# Altium footprint library 3D_MIG_Controller.PCBLIB: 560 footprints (part 29 of 35)
Each footprint in its own frame and in the unit in brackets; x right, y up, seen from the top. Pads: shape width x height; smd on the part's side, far side on the other; paste and mask are expansions set on the pad; w line width, h text height; cw(c..) or ccw(c..) is an arc to the next point about the centre after c.
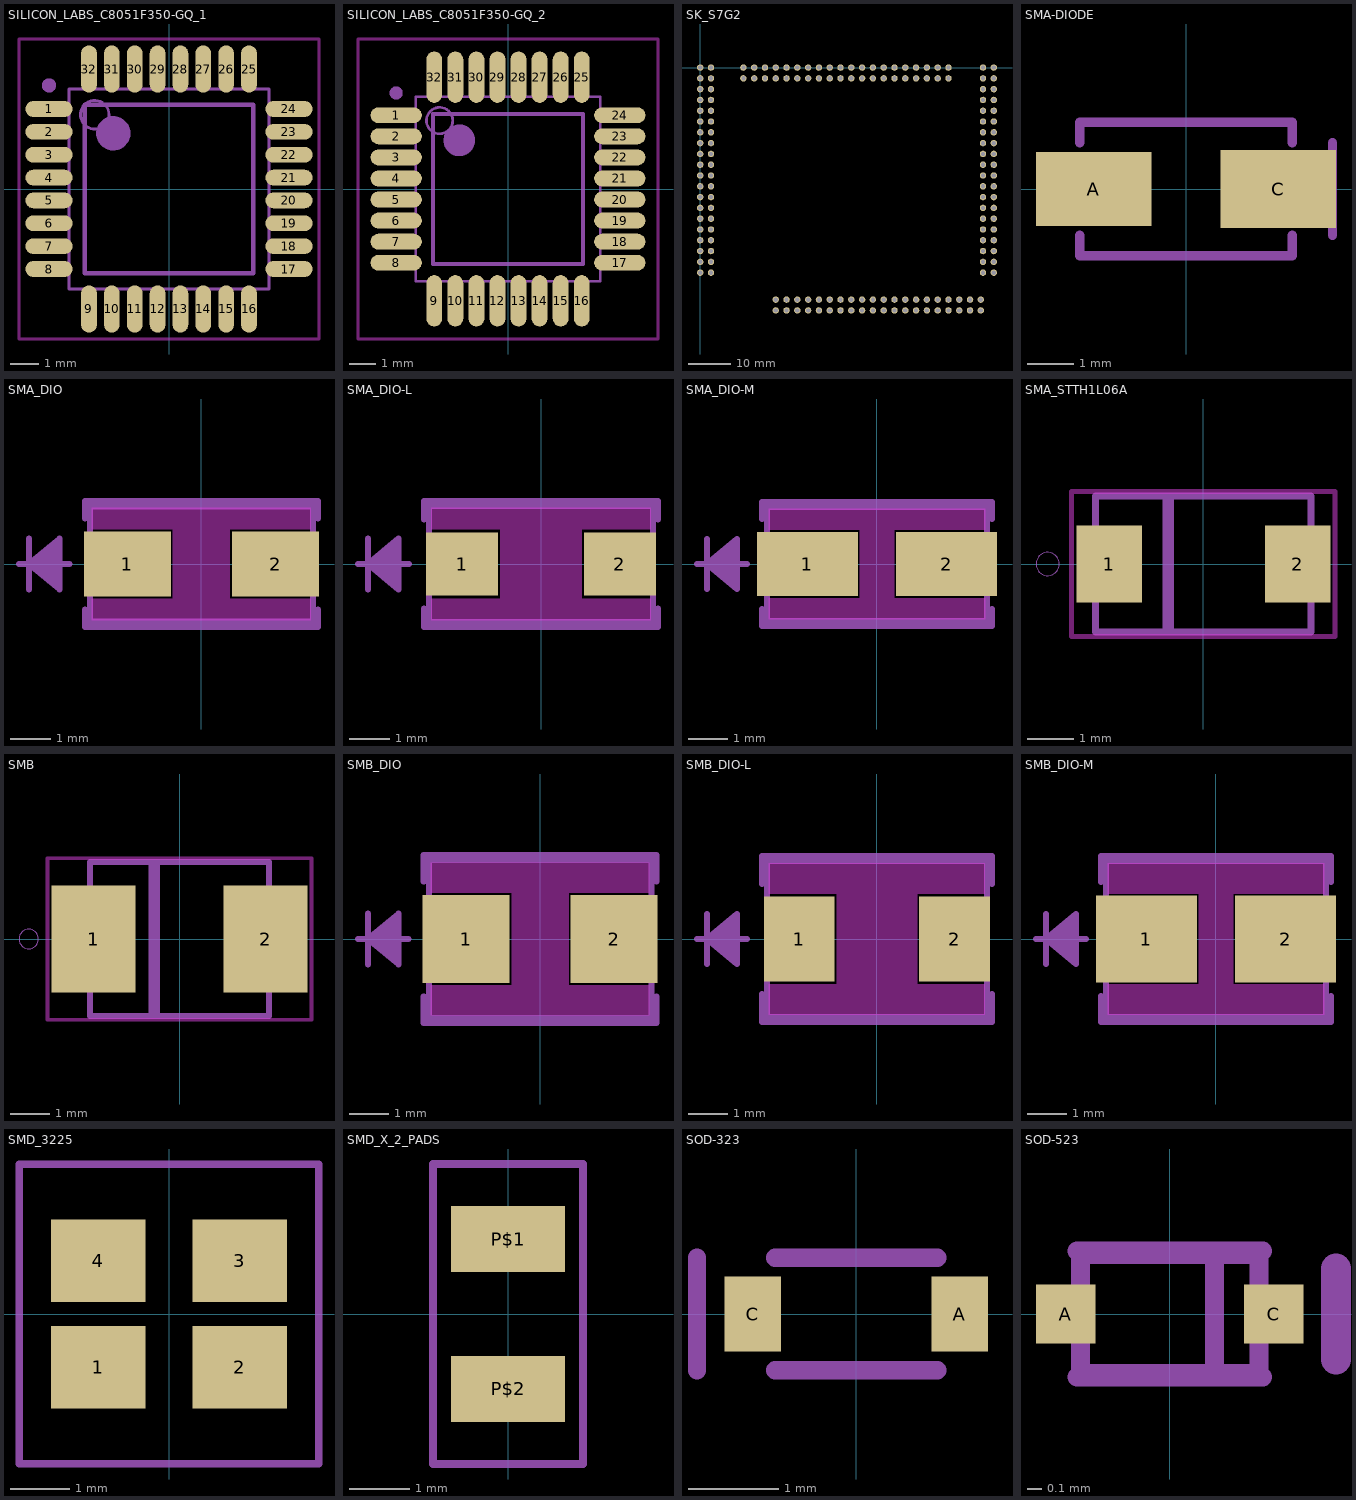
[diagram p28: the footprints below, top view; thin cyan lines are the x and y axes]

## SILICON_LABS_C8051F350-GQ_1 [mm]
pads (32):
  rrect100% 1.65x0.55 smd: 1(-4.2,2.8) 2(-4.2,2) 3(-4.2,1.2) 4(-4.2,0.4) 5(-4.2,-0.4) 6(-4.2,-1.2) 7(-4.2,-2) 8(-4.2,-2.8) 17(4.2,-2.8) 18(4.2,-2) 19(4.2,-1.2) 20(4.2,-0.4) 21(4.2,0.4) 22(4.2,1.2) 23(4.2,2) 24(4.2,2.8)
  rrect100% 0.55x1.65 smd: 9(-2.8,-4.2) 10(-2,-4.2) 11(-1.2,-4.2) 12(-0.4,-4.2) 13(0.4,-4.2) 14(1.2,-4.2) 15(2,-4.2) 16(2.8,-4.2) 25(2.8,4.2) 26(2,4.2) 27(1.2,4.2) 28(0.4,4.2) 29(-0.4,4.2) 30(-1.2,4.2) 31(-2,4.2) 32(-2.8,4.2)
Top keep-out:
  lines w0.1: -5.25,-5.25 -5.25,5.25 5.25,5.25 5.25,-5.25 -5.25,-5.25
tDocu:
  circle w0.1: c-2.6,2.6 r0.5
  lines w0.1: -3.5,-3.5 3.5,-3.5 3.5,3.5 -3.5,3.5 -3.5,-3.5
tPlace:
  circle w0.6: c-1.95,1.95 r0.3
  circle w0.25: c-4.2,3.625 r0.125
  lines w0.15: -2.95,-2.95 2.95,-2.95 2.95,2.95 -2.95,2.95 -2.95,-2.95

## SILICON_LABS_C8051F350-GQ_2 [mm]
pads (32):
  rrect100% 1.95x0.6 smd: 1(-4.25,2.8) 2(-4.25,2) 3(-4.25,1.2) 4(-4.25,0.4) 5(-4.25,-0.4) 6(-4.25,-1.2) 7(-4.25,-2) 8(-4.25,-2.8) 17(4.25,-2.8) 18(4.25,-2) 19(4.25,-1.2) 20(4.25,-0.4) 21(4.25,0.4) 22(4.25,1.2) 23(4.25,2) 24(4.25,2.8)
  rrect100% 0.6x1.95 smd: 9(-2.8,-4.25) 10(-2,-4.25) 11(-1.2,-4.25) 12(-0.4,-4.25) 13(0.4,-4.25) 14(1.2,-4.25) 15(2,-4.25) 16(2.8,-4.25) 25(2.8,4.25) 26(2,4.25) 27(1.2,4.25) 28(0.4,4.25) 29(-0.4,4.25) 30(-1.2,4.25) 31(-2,4.25) 32(-2.8,4.25)
Top keep-out:
  lines w0.1: -5.7,-5.7 -5.7,5.7 5.7,5.7 5.7,-5.7 -5.7,-5.7
tDocu:
  circle w0.1: c-2.6,2.6 r0.5
  lines w0.1: -3.5,-3.5 -3.5,3.5 3.5,3.5 3.5,-3.5 -3.5,-3.5
tPlace:
  circle w0.25: c-4.25,3.65 r0.125
  circle w0.6: c-1.85,1.85 r0.3
  lines w0.15: -2.85,-2.85 -2.85,2.85 2.85,2.85 2.85,-2.85 -2.85,-2.85

## SK_S7G2 [mm]
pads (160):
  round 1.508 hole 1: J20GND1(69.088,-45.72) J20GND2(66.548,-45.72) J20GND3(66.548,-2.54) J20NC1(66.548,-43.18) J20NC2(66.548,-40.64) J20NC3(66.548,-38.1) J20VCC(69.088,-2.54) J21GND1(2.54,-45.72) J21GND2(0,-2.54) J21VCC(0,-45.72) J22GND1(63.5,-54.61) J22VCC(63.5,-57.15) J23GND1(55.88,0) J23GND2(12.7,0) J23GND3(12.7,-2.54) J23NC1(33.02,0) J23NC2(35.56,-2.54) J23NC3(20.32,-2.54) J23VCC(55.88,-2.54) J2001(66.548,0) J2002(69.088,0) J2039(66.548,-48.26) J2040(69.088,-48.26) J2101(2.54,-48.26) J2102(0,-48.26) J2139(2.54,0) J2140(0,0) J2201(66.04,-54.61) J2202(66.04,-57.15) J2239(17.78,-54.61) J2240(17.78,-57.15) J2301(58.42,0) J2339(10.16,0) J2340(10.16,-2.54) J3202(58.42,-2.54) P00(66.548,-5.08) P001(66.548,-7.62) P002(66.548,-10.16) P003(66.548,-12.7) P004(66.548,-15.24) P005(66.548,-17.78) P006(66.548,-20.32) P007(66.548,-22.86) P008(66.548,-25.4) P009(66.548,-27.94) P010(66.548,-30.48) P014(66.548,-33.02) P015(66.548,-35.56) P42(53.34,-54.61) P100(69.088,-5.08) P101(69.088,-7.62) P102(69.088,-10.16) P103(69.088,-12.7) P104(69.088,-15.24) P105(69.088,-17.78) P106(69.088,-20.32) P107(69.088,-22.86) P108(69.088,-25.4) P109(69.088,-27.94) P110(69.088,-30.48) P111(69.088,-33.02) P112(69.088,-35.56) P113(69.088,-38.1) P114(69.088,-40.64) P115(69.088,-43.18) P200(2.54,-43.18) P201(2.54,-40.64) P202(2.54,-38.1) P203(2.54,-35.56) P204(2.54,-33.02) P205(2.54,-30.48) P206(2.54,-27.94) P207(2.54,-25.4) P300(0,-43.18) P301(0,-40.64) P302(0,-38.1) P303(0,-35.56) P304(0,-33.02) P305(0,-30.48) P306(0,-27.94) P307(0,-25.4) P308(0,-22.86) P309(0,-20.32) P310(0,-17.78) P311(0,-15.24) P312(0,-12.7) P313(0,-10.16) P314(0,-7.62) P315(0,-5.08) P400(2.54,-22.86) P401(2.54,-20.32) P402(2.54,-17.78) P403(2.54,-15.24) P404(2.54,-12.7) P405(2.54,-10.16) P406(2.54,-7.62) P407(2.54,-5.08) P408(2.54,-2.54) P409(60.96,-54.61) P410(58.42,-54.61) P411(55.88,-54.61) P413(50.8,-54.61) P414(48.26,-54.61) P415(45.72,-54.61) P500(43.18,-54.61) P501(40.64,-54.61) P502(38.1,-54.61) P503(35.56,-54.61) P504(33.02,-54.61) P505(30.48,-54.61) P506(27.94,-54.61) P507(25.4,-54.61) P511(22.86,-54.61) P512(20.32,-54.61) P513(20.32,-57.15) P600(60.96,-57.15) P601(58.42,-57.15) P602(55.88,-57.15) P603(53.34,-57.15) P604(50.8,-57.15) P605(48.26,-57.15) P606(45.72,-57.15) P607(43.18,-57.15) P608(40.64,-57.15) P609(38.1,-57.15) P610(35.56,-57.15) P611(33.02,-57.15) P612(30.48,-57.15) P613(27.94,-57.15) P614(25.4,-57.15) P615(22.86,-57.15) P700(53.34,0) P701(50.8,0) P702(48.26,0) P703(45.72,0) P704(43.18,0) P705(40.64,0) P706(38.1,0) P707(35.56,0) P800(30.48,0) P801(27.94,0) P802(25.4,0) P803(22.86,0) P804(20.32,0) P805(17.78,0) P806(15.24,0) P900(50.8,-2.54) P901(48.26,-2.54) P905(45.72,-2.54) P906(43.18,-2.54) P907(40.64,-2.54) P908(38.1,-2.54) PA00(33.02,-2.54) PA01(30.48,-2.54) PA08(27.94,-2.54) PA09(25.4,-2.54) PA10(22.86,-2.54) PB00(17.78,-2.54) PB01(15.24,-2.54) RESET(53.34,-2.54)
tPlace:
  text "J20" at 66.548,-51.435 h1.57
  text "J21" at 0.127,-51.308 h1.57
  text "J22" at 13.208,-56.642 h1.57
  text "J23" at 9.652,-6.096 h1.57

## SMA-DIODE [mm]
pads (2):
  rect 2.5x1.6 smd: A(-2,0)
  rect 2.5x1.7 smd: C(2,0)
tPlace:
  lines w0.203: -2.3,-1 -2.3,-1.45 2.3,-1.45 2.3,-1 ; -2.3,1 -2.3,1.45 2.3,1.45 2.3,1 ; 3.175,-1 3.175,1

## SMA_DIO [mil]
pads (2):
  rect 85.84x64.17 smd: 1(-73.12,0) 2(73.12,0)
Top keep-out:
  region: -28.2,34.09 28.2,34.09 28.2,-34.09 -28.2,-34.09
  region: -108.04,55.48 108.04,55.48 108.04,34.09 -108.04,34.09
  region: -108.04,-34.09 108.04,-34.09 108.04,-55.48 -108.04,-55.48
tDocu:
  lines w6: -180,0 -170,0 ; -170,-25 -170,0 ; -170,25 -170,0 ; -140,-20 -170,0 ; -140,-15 -170,0 ; -140,-10 -170,0 ; -140,-5 -170,0 ; -140,5 -170,0 ; -140,10 -170,0 ; -140,15 -170,0 ; -140,20 -170,0 ; -130,0 -170,0 ; -170,0 -140,25 -140,-25 -170,0 ; -110,-57 110,-57 110,57 -110,57 -110,-57
tPlace:
  lines w6: -180,0 -170,0 ; -170,-25 -170,0 ; -170,25 -170,0 ; -140,-20 -170,0 ; -140,-15 -170,0 ; -140,-10 -170,0 ; -140,-5 -170,0 ; -140,5 -170,0 ; -140,10 -170,0 ; -140,15 -170,0 ; -140,20 -170,0 ; -130,0 -170,0 ; -115,-45 -115,-62 115,-62 115,-45 ; -115,45 -115,62 115,62 115,45 ; -170,0 -140,25 -140,-25 -170,0

## SMA_DIO-L [mil]
pads (2):
  rect 70.84x62.17 smd: 1(-77.62,0) 2(77.62,0)
Top keep-out:
  region: -40.2,34.09 40.2,34.09 40.2,-34.09 -40.2,-34.09
  region: -108.04,55.48 108.04,55.48 108.04,34.09 -108.04,34.09
  region: -108.04,-34.09 108.04,-34.09 108.04,-55.48 -108.04,-55.48
tDocu:
  lines w6: -180,0 -170,0 ; -170,-25 -170,0 ; -170,25 -170,0 ; -140,-20 -170,0 ; -140,-15 -170,0 ; -140,-10 -170,0 ; -140,-5 -170,0 ; -140,5 -170,0 ; -140,10 -170,0 ; -140,15 -170,0 ; -140,20 -170,0 ; -130,0 -170,0 ; -170,0 -140,25 -140,-25 -170,0 ; -110,-57 110,-57 110,57 -110,57 -110,-57
tPlace:
  lines w6: -180,0 -170,0 ; -170,-25 -170,0 ; -170,25 -170,0 ; -140,-20 -170,0 ; -140,-15 -170,0 ; -140,-10 -170,0 ; -140,-5 -170,0 ; -140,5 -170,0 ; -140,10 -170,0 ; -140,15 -170,0 ; -140,20 -170,0 ; -130,0 -170,0 ; -115,-44 -115,-62 115,-62 115,-44 ; -115,44 -115,62 115,62 115,44 ; -170,0 -140,25 -140,-25 -170,0

## SMA_DIO-M [mil]
pads (2):
  rect 100.84x64.17 smd: 1(-69.62,0) 2(69.62,0)
Top keep-out:
  region: -17.2,34.09 17.2,34.09 17.2,-34.09 -17.2,-34.09
  region: -108.04,55.48 108.04,55.48 108.04,34.09 -108.04,34.09
  region: -108.04,-34.09 108.04,-34.09 108.04,-55.48 -108.04,-55.48
tDocu:
  lines w6: -180,0 -170,0 ; -170,-25 -170,0 ; -170,25 -170,0 ; -140,-20 -170,0 ; -140,-15 -170,0 ; -140,-10 -170,0 ; -140,-5 -170,0 ; -140,5 -170,0 ; -140,10 -170,0 ; -140,15 -170,0 ; -140,20 -170,0 ; -130,0 -170,0 ; -170,0 -140,25 -140,-25 -170,0 ; -110,-57 110,-57 110,57 -110,57 -110,-57
tPlace:
  lines w6: -180,0 -170,0 ; -170,-25 -170,0 ; -170,25 -170,0 ; -140,-20 -170,0 ; -140,-15 -170,0 ; -140,-10 -170,0 ; -140,-5 -170,0 ; -140,5 -170,0 ; -140,10 -170,0 ; -140,15 -170,0 ; -140,20 -170,0 ; -133,0 -170,0 ; -115,-45 -115,-62 115,-62 115,-45 ; -115,45 -115,62 115,62 115,45 ; -170,0 -140,25 -140,-25 -170,0

## SMA_STTH1L06A [mm]
pads (2):
  rect 1.4x1.64 smd: 1(-2.015,0) 2(2.015,0)
Top keep-out:
  lines w0.1: -2.815,-1.55 -2.815,1.55 2.815,1.55 2.815,-1.55 -2.815,-1.55
tDocu:
  lines w0.15: -2.3,-1.45 -2.3,1.45 2.3,1.45 2.3,-1.45 -2.3,-1.45
tPlace:
  circle w0: c-3.325,0 r0.25
  lines w0.15: -2.3,-1.195 -2.3,-1.45 2.3,-1.45 2.3,-1.195 ; -2.3,1.195 -2.3,1.45 2.3,1.45 2.3,1.195
  lines w0.25: -0.75,-1.35 -0.75,1.35

## SMB [mil]
pads (2):
  rect 85x107.99 smd: 1(-87.01,0) 2(87.01,0)
Top keep-out:
  lines w3.94: -133.43,-81.69 -133.43,81.69 133.43,81.69 133.43,-81.69 -133.43,-81.69
tDocu:
  lines w5.91: -90.55,-77.76 -90.55,77.76 90.55,77.76 90.55,-77.76 -90.55,-77.76
tPlace:
  circle w0: c-152.56,0 r9.84
  lines w5.91: -90.55,-68.74 -90.55,-77.76 90.55,-77.76 90.55,-68.74 ; -90.55,68.74 -90.55,77.76 90.55,77.76 90.55,68.74
  lines w11.81: -25.59,-74.8 -25.59,74.8

## SMB_DIO [mil]
pads (2):
  rect 85.84x87.01 smd: 1(-73.12,0) 2(73.12,0)
Top keep-out:
  region: -28.2,45.5 28.2,45.5 28.2,-45.5 -28.2,-45.5
  region: -108.04,75.56 108.04,75.56 108.04,45.5 -108.04,45.5
  region: -108.04,-45.5 108.04,-45.5 108.04,-75.56 -108.04,-75.56
tDocu:
  lines w6: -180,0 -170,0 ; -170,-25 -170,0 ; -170,25 -170,0 ; -140,-20 -170,0 ; -140,-15 -170,0 ; -140,-10 -170,0 ; -140,-5 -170,0 ; -140,5 -170,0 ; -140,10 -170,0 ; -140,15 -170,0 ; -140,20 -170,0 ; -130,0 -170,0 ; -170,0 -140,25 -140,-25 -170,0 ; -110,-78 110,-78 110,78 -110,78 -110,-78
tPlace:
  lines w6: -180,0 -170,0 ; -170,-25 -170,0 ; -170,25 -170,0 ; -140,-20 -170,0 ; -140,-15 -170,0 ; -140,-10 -170,0 ; -140,-5 -170,0 ; -140,5 -170,0 ; -140,10 -170,0 ; -140,15 -170,0 ; -140,20 -170,0 ; -130,0 -170,0 ; -115,-57 -115,-83 115,-83 115,-57 ; -115,57 -115,83 115,83 115,57 ; -170,0 -140,25 -140,-25 -170,0

## SMB_DIO-L [mil]
pads (2):
  rect 70.84x85.01 smd: 1(-77.62,0) 2(77.62,0)
Top keep-out:
  region: -40.2,45.5 40.2,45.5 40.2,-45.5 -40.2,-45.5
  region: -108.04,75.56 108.04,75.56 108.04,45.5 -108.04,45.5
  region: -108.04,-45.5 108.04,-45.5 108.04,-75.56 -108.04,-75.56
tDocu:
  lines w6: -180,0 -170,0 ; -170,-25 -170,0 ; -170,25 -170,0 ; -140,-20 -170,0 ; -140,-15 -170,0 ; -140,-10 -170,0 ; -140,-5 -170,0 ; -140,5 -170,0 ; -140,10 -170,0 ; -140,15 -170,0 ; -140,20 -170,0 ; -130,0 -170,0 ; -170,0 -140,25 -140,-25 -170,0 ; -110,-78 110,-78 110,78 -110,78 -110,-78
tPlace:
  lines w6: -180,0 -170,0 ; -170,-25 -170,0 ; -170,25 -170,0 ; -140,-20 -170,0 ; -140,-15 -170,0 ; -140,-10 -170,0 ; -140,-5 -170,0 ; -140,5 -170,0 ; -140,10 -170,0 ; -140,15 -170,0 ; -140,20 -170,0 ; -130,0 -170,0 ; -115,-55 -115,-83 115,-83 115,-55 ; -115,55 -115,83 115,83 115,55 ; -170,0 -140,25 -140,-25 -170,0

## SMB_DIO-M [mil]
pads (2):
  rect 100.84x87.01 smd: 1(-69.62,0) 2(69.62,0)
Top keep-out:
  region: -17.2,45.5 17.2,45.5 17.2,-45.5 -17.2,-45.5
  region: -108.04,75.56 108.04,75.56 108.04,45.5 -108.04,45.5
  region: -108.04,-45.5 108.04,-45.5 108.04,-75.56 -108.04,-75.56
tDocu:
  lines w6: -180,0 -170,0 ; -170,-25 -170,0 ; -170,25 -170,0 ; -140,-20 -170,0 ; -140,-15 -170,0 ; -140,-10 -170,0 ; -140,-5 -170,0 ; -140,5 -170,0 ; -140,10 -170,0 ; -140,15 -170,0 ; -140,20 -170,0 ; -130,0 -170,0 ; -170,0 -140,25 -140,-25 -170,0 ; -110,-78 110,-78 110,78 -110,78 -110,-78
tPlace:
  lines w6: -180,0 -170,0 ; -170,-25 -170,0 ; -170,25 -170,0 ; -140,-20 -170,0 ; -140,-15 -170,0 ; -140,-10 -170,0 ; -140,-5 -170,0 ; -140,5 -170,0 ; -140,10 -170,0 ; -140,15 -170,0 ; -140,20 -170,0 ; -133,0 -170,0 ; -115,-57 -115,-83 115,-83 115,-57 ; -115,57 -115,83 115,83 115,57 ; -170,0 -140,25 -140,-25 -170,0

## SMD_3225 [mil]
pads (4):
  rect 62.99x55.12 smd: 1(-47.24,-35.43) 2(47.24,-35.43) 3(47.24,35.43) 4(-47.24,35.43)
tPlace:
  lines w5: -100,-100 -100,100 100,100 100,-100 -100,-100

## SMD_X_2_PADS [mil]
pads (2):
  rect 74.8x43.31 smd: P$1(0,49.21) P$2(0,-49.21)
tPlace:
  lines w5: -49.21,-98.43 -49.21,98.43 49.21,98.43 49.21,-98.43 -49.21,-98.43

## SOD-323 [mil]
pads (2):
  rect 24.8x32.68 smd: A(45.28,0) C(-45.28,0)
tPlace:
  lines w8: -69.69,-24.61 -69.69,24.61 ; -35.43,-24.61 35.43,-24.61 ; -35.43,24.61 35.43,24.61

## SOD-523 [mil]
pads (2):
  rect 15.75x15.75 smd: A(-27.56,0) C(27.56,0)
tDocu:
  lines w5: -23.62,-3.94 -23.62,3.94 ; -23.62,-3.94 -23.62,-15.75 11.81,-15.75 ; -23.62,-3.94 -31.5,-3.94 -31.5,3.94 -23.62,3.94 ; -23.62,3.94 -23.62,15.75 11.81,15.75 ; 11.81,-15.75 23.62,-15.75 23.62,-3.94 ; 11.81,-15.75 11.81,15.75 ; 11.81,15.75 23.62,15.75 23.62,3.94 ; 23.62,-3.94 23.62,3.94 ; 23.62,-3.94 31.5,-3.94 31.5,3.94 23.62,3.94
tPlace:
  lines w5: -24.61,-16.73 24.61,-16.73 ; -24.61,16.73 24.61,16.73
  lines w8: 44,-12 44,12